# Altium footprint library con-samtec.PCBLIB: 805 footprints (part 41 of 55)
Each footprint in its own frame and in the unit in brackets; x right, y up, seen from the top. Pads: shape width x height; smd on the part's side, far side on the other; paste and mask are expansions set on the pad; w line width, h text height; cw(c..) or ccw(c..) is an arc to the next point about the centre after c.
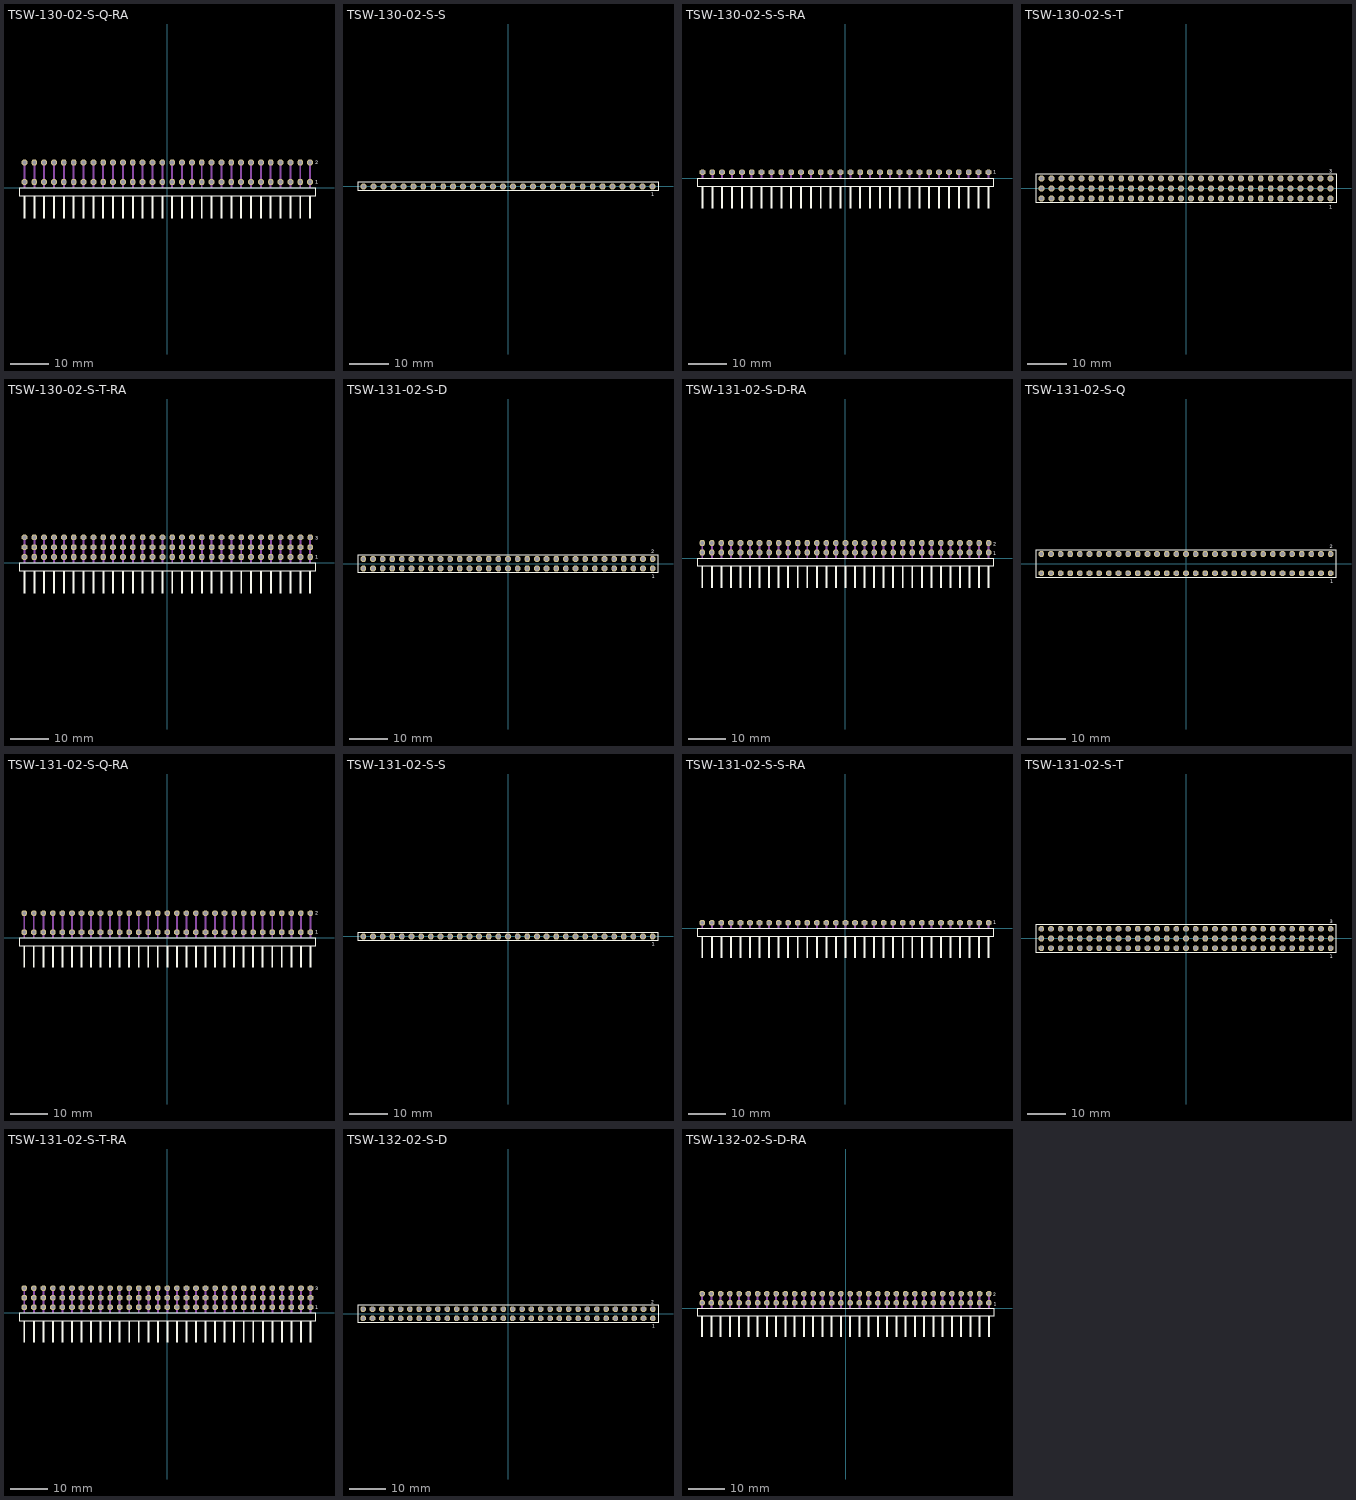
[diagram p40: the footprints below, top view; thin cyan lines are the x and y axes]

## TSW-130-02-S-Q-RA [mil]
pads (60):
  oct 59.06x59.06 hole 39.37: 1(1450,60) 2(1450,260) 3(1350,60) 4(1350,260) 5(1250,60) 6(1250,260) 7(1150,60) 8(1150,260) 9(1050,60) 10(1050,260) 11(950,60) 12(950,260) 13(850,60) 14(850,260) 15(750,60) 16(750,260) 17(650,60) 18(650,260) 19(550,60) 20(550,260) 21(450,60) 22(450,260) 23(350,60) 24(350,260) 25(250,60) 26(250,260) 27(150,60) 28(150,260) 29(50,60) 30(50,260) 31(-50,60) 32(-50,260) 33(-150,60) 34(-150,260) 35(-250,60) 36(-250,260) 37(-350,60) 38(-350,260) 39(-450,60) 40(-450,260) 41(-550,60) 42(-550,260) 43(-650,60) 44(-650,260) 45(-750,60) 46(-750,260) 47(-850,60) 48(-850,260) 49(-950,60) 50(-950,260) 51(-1050,60) 52(-1050,260) 53(-1150,60) 54(-1150,260) 55(-1250,60) 56(-1250,260) 57(-1350,60) 58(-1350,260) 59(-1450,60) 60(-1450,260)
Top Overlay:
  rectangle: -1460,-310.63 -1440,-80.32
  rectangle: -1360,-310.63 -1340,-80.32
  rectangle: -1260,-310.63 -1240,-80.32
  rectangle: -1160,-310.63 -1140,-80.32
  rectangle: -1060,-310.63 -1040,-80.32
  rectangle: -960,-310.63 -940,-80.32
  rectangle: -860,-310.63 -840,-80.32
  rectangle: -760,-310.63 -740,-80.32
  rectangle: -660,-310.63 -640,-80.32
  rectangle: -560,-310.63 -540,-80.32
  rectangle: -460,-310.63 -440,-80.32
  rectangle: -360,-310.63 -340,-80.32
  rectangle: -260,-310.63 -240,-80.32
  rectangle: -160,-310.63 -140,-80.32
  rectangle: -60,-310.63 -40,-80.32
  rectangle: 40,-310.63 60,-80.32
  rectangle: 140,-310.63 160,-80.32
  rectangle: 240,-310.63 260,-80.32
  rectangle: 340,-310.63 360,-80.32
  rectangle: 440,-310.63 460,-80.32
  rectangle: 540,-310.63 560,-80.32
  rectangle: 640,-310.63 660,-80.32
  rectangle: 740,-310.63 760,-80.32
  rectangle: 840,-310.63 860,-80.32
  rectangle: 940,-310.63 960,-80.32
  rectangle: 1040,-310.63 1060,-80.32
  rectangle: 1140,-310.63 1160,-80.32
  rectangle: 1240,-310.63 1260,-80.32
  rectangle: 1340,-310.63 1360,-80.32
  rectangle: 1440,-310.63 1460,-80.32
  lines w8: -1505.08,-80.55 1505.08,-80.55 1505.08,-4.17 -1505.08,-4.17 -1505.08,-80.55
  text "1" at 1503.54,43.31 h36.81
  text "2" at 1501.18,242.72 h36.81
Mechanical 16:
  rectangle: -1460,0 -1440,270
  rectangle: -1360,0 -1340,270
  rectangle: -1260,0 -1240,270
  rectangle: -1160,0 -1140,270
  rectangle: -1060,0 -1040,270
  rectangle: -960,0 -940,270
  rectangle: -860,0 -840,270
  rectangle: -760,0 -740,270
  rectangle: -660,0 -640,270
  rectangle: -560,0 -540,270
  rectangle: -460,0 -440,270
  rectangle: -360,0 -340,270
  rectangle: -260,0 -240,270
  rectangle: -160,0 -140,270
  rectangle: -60,0 -40,270
  rectangle: 40,0 60,270
  rectangle: 140,0 160,270
  rectangle: 240,0 260,270
  rectangle: 340,0 360,270
  rectangle: 440,0 460,270
  rectangle: 540,0 560,270
  rectangle: 640,0 660,270
  rectangle: 740,0 760,270
  rectangle: 840,0 860,270
  rectangle: 940,0 960,270
  rectangle: 1040,0 1060,270
  rectangle: 1140,0 1160,270
  rectangle: 1240,0 1260,270
  rectangle: 1340,0 1360,270
  rectangle: 1440,0 1460,270

## TSW-130-02-S-S [mm]
pads (30):
  oct 1.5x1.5 hole 1: 1(36.83,0) 2(34.29,0) 3(31.75,0) 4(29.21,0) 5(26.67,0) 6(24.13,0) 7(21.59,0) 8(19.05,0) 9(16.51,0) 10(13.97,0) 11(11.43,0) 12(8.89,0) 13(6.35,0) 14(3.81,0) 15(1.27,0) 16(-1.27,0) 17(-3.81,0) 18(-6.35,0) 19(-8.89,0) 20(-11.43,0) 21(-13.97,0) 22(-16.51,0) 23(-19.05,0) 24(-21.59,0) 25(-24.13,0) 26(-26.67,0) 27(-29.21,0) 28(-31.75,0) 29(-34.29,0) 30(-36.83,0)
Top Overlay:
  lines w0.203: -38.229,-1.155 38.229,-1.155 38.229,1.155 -38.229,1.155 -38.229,-1.155
  text "1" at 36.572,-2.498 h0.94
Mechanical 16:
  rectangle: -37.18,-0.35 -36.48,0.35
  rectangle: -34.64,-0.35 -33.94,0.35
  rectangle: -32.1,-0.35 -31.4,0.35
  rectangle: -29.56,-0.35 -28.86,0.35
  rectangle: -27.02,-0.35 -26.32,0.35
  rectangle: -24.48,-0.35 -23.78,0.35
  rectangle: -21.94,-0.35 -21.24,0.35
  rectangle: -19.4,-0.35 -18.7,0.35
  rectangle: -16.86,-0.35 -16.16,0.35
  rectangle: -14.32,-0.35 -13.62,0.35
  rectangle: -11.78,-0.35 -11.08,0.35
  rectangle: -9.24,-0.35 -8.54,0.35
  rectangle: -6.7,-0.35 -6,0.35
  rectangle: -4.16,-0.35 -3.46,0.35
  rectangle: -1.62,-0.35 -0.92,0.35
  rectangle: 0.92,-0.35 1.62,0.35
  rectangle: 3.46,-0.35 4.16,0.35
  rectangle: 6,-0.35 6.7,0.35
  rectangle: 8.54,-0.35 9.24,0.35
  rectangle: 11.08,-0.35 11.78,0.35
  rectangle: 13.62,-0.35 14.32,0.35
  rectangle: 16.16,-0.35 16.86,0.35
  rectangle: 18.7,-0.35 19.4,0.35
  rectangle: 21.24,-0.35 21.94,0.35
  rectangle: 23.78,-0.35 24.48,0.35
  rectangle: 26.32,-0.35 27.02,0.35
  rectangle: 28.86,-0.35 29.56,0.35
  rectangle: 31.4,-0.35 32.1,0.35
  rectangle: 33.94,-0.35 34.64,0.35
  rectangle: 36.48,-0.35 37.18,0.35

## TSW-130-02-S-S-RA [mil]
pads (30):
  oct 59.06x59.06 hole 39.37: 1(1450,60) 2(1350,60) 3(1250,60) 4(1150,60) 5(1050,60) 6(950,60) 7(850,60) 8(750,60) 9(650,60) 10(550,60) 11(450,60) 12(350,60) 13(250,60) 14(150,60) 15(50,60) 16(-50,60) 17(-150,60) 18(-250,60) 19(-350,60) 20(-450,60) 21(-550,60) 22(-650,60) 23(-750,60) 24(-850,60) 25(-950,60) 26(-1050,60) 27(-1150,60) 28(-1250,60) 29(-1350,60) 30(-1450,60)
Top Overlay:
  rectangle: -1460,-310.63 -1440,-80.32
  rectangle: -1360,-310.63 -1340,-80.32
  rectangle: -1260,-310.63 -1240,-80.32
  rectangle: -1160,-310.63 -1140,-80.32
  rectangle: -1060,-310.63 -1040,-80.32
  rectangle: -960,-310.63 -940,-80.32
  rectangle: -860,-310.63 -840,-80.32
  rectangle: -760,-310.63 -740,-80.32
  rectangle: -660,-310.63 -640,-80.32
  rectangle: -560,-310.63 -540,-80.32
  rectangle: -460,-310.63 -440,-80.32
  rectangle: -360,-310.63 -340,-80.32
  rectangle: -260,-310.63 -240,-80.32
  rectangle: -160,-310.63 -140,-80.32
  rectangle: -60,-310.63 -40,-80.32
  rectangle: 40,-310.63 60,-80.32
  rectangle: 140,-310.63 160,-80.32
  rectangle: 240,-310.63 260,-80.32
  rectangle: 340,-310.63 360,-80.32
  rectangle: 440,-310.63 460,-80.32
  rectangle: 540,-310.63 560,-80.32
  rectangle: 640,-310.63 660,-80.32
  rectangle: 740,-310.63 760,-80.32
  rectangle: 840,-310.63 860,-80.32
  rectangle: 940,-310.63 960,-80.32
  rectangle: 1040,-310.63 1060,-80.32
  rectangle: 1140,-310.63 1160,-80.32
  rectangle: 1240,-310.63 1260,-80.32
  rectangle: 1340,-310.63 1360,-80.32
  rectangle: 1440,-310.63 1460,-80.32
  lines w8: -1505.08,-80.55 1505.08,-80.55 1505.08,-4.17 -1505.08,-4.17 -1505.08,-80.55
  text "1" at 1500.47,45.35 h36.81
Mechanical 16:
  rectangle: -1460,0 -1440,70
  rectangle: -1360,0 -1340,70
  rectangle: -1260,0 -1240,70
  rectangle: -1160,0 -1140,70
  rectangle: -1060,0 -1040,70
  rectangle: -960,0 -940,70
  rectangle: -860,0 -840,70
  rectangle: -760,0 -740,70
  rectangle: -660,0 -640,70
  rectangle: -560,0 -540,70
  rectangle: -460,0 -440,70
  rectangle: -360,0 -340,70
  rectangle: -260,0 -240,70
  rectangle: -160,0 -140,70
  rectangle: -60,0 -40,70
  rectangle: 40,0 60,70
  rectangle: 140,0 160,70
  rectangle: 240,0 260,70
  rectangle: 340,0 360,70
  rectangle: 440,0 460,70
  rectangle: 540,0 560,70
  rectangle: 640,0 660,70
  rectangle: 740,0 760,70
  rectangle: 840,0 860,70
  rectangle: 940,0 960,70
  rectangle: 1040,0 1060,70
  rectangle: 1140,0 1160,70
  rectangle: 1240,0 1260,70
  rectangle: 1340,0 1360,70
  rectangle: 1440,0 1460,70

## TSW-130-02-S-T [mm]
pads (90):
  oct 1.5x1.5 hole 1: 1(36.83,-2.54) 2(36.83,0) 3(36.83,2.54) 4(34.29,-2.54) 5(34.29,0) 6(34.29,2.54) 7(31.75,-2.54) 8(31.75,0) 9(31.75,2.54) 10(29.21,-2.54) 11(29.21,0) 12(29.21,2.54) 13(26.67,-2.54) 14(26.67,0) 15(26.67,2.54) 16(24.13,-2.54) 17(24.13,0) 18(24.13,2.54) 19(21.59,-2.54) 20(21.59,0) 21(21.59,2.54) 22(19.05,-2.54) 23(19.05,0) 24(19.05,2.54) 25(16.51,-2.54) 26(16.51,0) 27(16.51,2.54) 28(13.97,-2.54) 29(13.97,0) 30(13.97,2.54) 31(11.43,-2.54) 32(11.43,0) 33(11.43,2.54) 34(8.89,-2.54) 35(8.89,0) 36(8.89,2.54) 37(6.35,-2.54) 38(6.35,0) 39(6.35,2.54) 40(3.81,-2.54) 41(3.81,0) 42(3.81,2.54) 43(1.27,-2.54) 44(1.27,0) 45(1.27,2.54) 46(-1.27,-2.54) 47(-1.27,0) 48(-1.27,2.54) 49(-3.81,-2.54) 50(-3.81,0) 51(-3.81,2.54) 52(-6.35,-2.54) 53(-6.35,0) 54(-6.35,2.54) 55(-8.89,-2.54) 56(-8.89,0) 57(-8.89,2.54) 58(-11.43,-2.54) 59(-11.43,0) 60(-11.43,2.54) 61(-13.97,-2.54) 62(-13.97,0) 63(-13.97,2.54) 64(-16.51,-2.54) 65(-16.51,0) 66(-16.51,2.54) 67(-19.05,-2.54) 68(-19.05,0) 69(-19.05,2.54) 70(-21.59,-2.54) 71(-21.59,0) 72(-21.59,2.54) 73(-24.13,-2.54) 74(-24.13,0) 75(-24.13,2.54) 76(-26.67,-2.54) 77(-26.67,0) 78(-26.67,2.54) 79(-29.21,-2.54) 80(-29.21,0) 81(-29.21,2.54) 82(-31.75,-2.54) 83(-31.75,0) 84(-31.75,2.54) 85(-34.29,-2.54) 86(-34.29,0) 87(-34.29,2.54) 88(-36.83,-2.54) 89(-36.83,0) 90(-36.83,2.54)
Top Overlay:
  lines w0.203: -38.229,-3.695 38.229,-3.695 38.229,3.695 -38.229,3.695 -38.229,-3.695
  text "1" at 36.522,-5.188 h0.94
  text "3" at 36.518,3.989 h0.94
Mechanical 16:
  rectangle: -37.18,-2.89 -36.48,-2.19
  rectangle: -37.18,-0.35 -36.48,0.35
  rectangle: -37.18,2.19 -36.48,2.89
  rectangle: -34.64,-2.89 -33.94,-2.19
  rectangle: -34.64,-0.35 -33.94,0.35
  rectangle: -34.64,2.19 -33.94,2.89
  rectangle: -32.1,-2.89 -31.4,-2.19
  rectangle: -32.1,-0.35 -31.4,0.35
  rectangle: -32.1,2.19 -31.4,2.89
  rectangle: -29.56,-2.89 -28.86,-2.19
  rectangle: -29.56,-0.35 -28.86,0.35
  rectangle: -29.56,2.19 -28.86,2.89
  rectangle: -27.02,-2.89 -26.32,-2.19
  rectangle: -27.02,-0.35 -26.32,0.35
  rectangle: -27.02,2.19 -26.32,2.89
  rectangle: -24.48,-2.89 -23.78,-2.19
  rectangle: -24.48,-0.35 -23.78,0.35
  rectangle: -24.48,2.19 -23.78,2.89
  rectangle: -21.94,-2.89 -21.24,-2.19
  rectangle: -21.94,-0.35 -21.24,0.35
  rectangle: -21.94,2.19 -21.24,2.89
  rectangle: -19.4,-2.89 -18.7,-2.19
  rectangle: -19.4,-0.35 -18.7,0.35
  rectangle: -19.4,2.19 -18.7,2.89
  rectangle: -16.86,-2.89 -16.16,-2.19
  rectangle: -16.86,-0.35 -16.16,0.35
  rectangle: -16.86,2.19 -16.16,2.89
  rectangle: -14.32,-2.89 -13.62,-2.19
  rectangle: -14.32,-0.35 -13.62,0.35
  rectangle: -14.32,2.19 -13.62,2.89
  rectangle: -11.78,-2.89 -11.08,-2.19
  rectangle: -11.78,-0.35 -11.08,0.35
  rectangle: -11.78,2.19 -11.08,2.89
  rectangle: -9.24,-2.89 -8.54,-2.19
  rectangle: -9.24,-0.35 -8.54,0.35
  rectangle: -9.24,2.19 -8.54,2.89
  rectangle: -6.7,-2.89 -6,-2.19
  rectangle: -6.7,-0.35 -6,0.35
  rectangle: -6.7,2.19 -6,2.89
  rectangle: -4.16,-2.89 -3.46,-2.19
  rectangle: -4.16,-0.35 -3.46,0.35
  rectangle: -4.16,2.19 -3.46,2.89
  rectangle: -1.62,-2.89 -0.92,-2.19
  rectangle: -1.62,-0.35 -0.92,0.35
  rectangle: -1.62,2.19 -0.92,2.89
  rectangle: 0.92,-2.89 1.62,-2.19
  rectangle: 0.92,-0.35 1.62,0.35
  rectangle: 0.92,2.19 1.62,2.89
  rectangle: 3.46,-2.89 4.16,-2.19
  rectangle: 3.46,-0.35 4.16,0.35
  rectangle: 3.46,2.19 4.16,2.89
  rectangle: 6,-2.89 6.7,-2.19
  rectangle: 6,-0.35 6.7,0.35
  rectangle: 6,2.19 6.7,2.89
  rectangle: 8.54,-2.89 9.24,-2.19
  rectangle: 8.54,-0.35 9.24,0.35
  rectangle: 8.54,2.19 9.24,2.89
  rectangle: 11.08,-2.89 11.78,-2.19
  rectangle: 11.08,-0.35 11.78,0.35
  rectangle: 11.08,2.19 11.78,2.89
  rectangle: 13.62,-2.89 14.32,-2.19
  rectangle: 13.62,-0.35 14.32,0.35
  rectangle: 13.62,2.19 14.32,2.89
  rectangle: 16.16,-2.89 16.86,-2.19
  rectangle: 16.16,-0.35 16.86,0.35
  rectangle: 16.16,2.19 16.86,2.89
  rectangle: 18.7,-2.89 19.4,-2.19
  rectangle: 18.7,-0.35 19.4,0.35
  rectangle: 18.7,2.19 19.4,2.89
  rectangle: 21.24,-2.89 21.94,-2.19
  rectangle: 21.24,-0.35 21.94,0.35
  rectangle: 21.24,2.19 21.94,2.89
  rectangle: 23.78,-2.89 24.48,-2.19
  rectangle: 23.78,-0.35 24.48,0.35
  rectangle: 23.78,2.19 24.48,2.89
  rectangle: 26.32,-2.89 27.02,-2.19
  rectangle: 26.32,-0.35 27.02,0.35
  rectangle: 26.32,2.19 27.02,2.89
  rectangle: 28.86,-2.89 29.56,-2.19
  rectangle: 28.86,-0.35 29.56,0.35
  rectangle: 28.86,2.19 29.56,2.89
  rectangle: 31.4,-2.89 32.1,-2.19
  rectangle: 31.4,-0.35 32.1,0.35
  rectangle: 31.4,2.19 32.1,2.89
  rectangle: 33.94,-2.89 34.64,-2.19
  rectangle: 33.94,-0.35 34.64,0.35
  rectangle: 33.94,2.19 34.64,2.89
  rectangle: 36.48,-2.89 37.18,-2.19
  rectangle: 36.48,-0.35 37.18,0.35
  rectangle: 36.48,2.19 37.18,2.89

## TSW-130-02-S-T-RA [mil]
pads (90):
  oct 59.06x59.06 hole 39.37: 1(1450,60) 2(1450,160) 3(1450,260) 4(1350,60) 5(1350,160) 6(1350,260) 7(1250,60) 8(1250,160) 9(1250,260) 10(1150,60) 11(1150,160) 12(1150,260) 13(1050,60) 14(1050,160) 15(1050,260) 16(950,60) 17(950,160) 18(950,260) 19(850,60) 20(850,160) 21(850,260) 22(750,60) 23(750,160) 24(750,260) 25(650,60) 26(650,160) 27(650,260) 28(550,60) 29(550,160) 30(550,260) 31(450,60) 32(450,160) 33(450,260) 34(350,60) 35(350,160) 36(350,260) 37(250,60) 38(250,160) 39(250,260) 40(150,60) 41(150,160) 42(150,260) 43(50,60) 44(50,160) 45(50,260) 46(-50,60) 47(-50,160) 48(-50,260) 49(-150,60) 50(-150,160) 51(-150,260) 52(-250,60) 53(-250,160) 54(-250,260) 55(-350,60) 56(-350,160) 57(-350,260) 58(-450,60) 59(-450,160) 60(-450,260) 61(-550,60) 62(-550,160) 63(-550,260) 64(-650,60) 65(-650,160) 66(-650,260) 67(-750,60) 68(-750,160) 69(-750,260) 70(-850,60) 71(-850,160) 72(-850,260) 73(-950,60) 74(-950,160) 75(-950,260) 76(-1050,60) 77(-1050,160) 78(-1050,260) 79(-1150,60) 80(-1150,160) 81(-1150,260) 82(-1250,60) 83(-1250,160) 84(-1250,260) 85(-1350,60) 86(-1350,160) 87(-1350,260) 88(-1450,60) 89(-1450,160) 90(-1450,260)
Top Overlay:
  rectangle: -1460,-310.63 -1440,-80.32
  rectangle: -1360,-310.63 -1340,-80.32
  rectangle: -1260,-310.63 -1240,-80.32
  rectangle: -1160,-310.63 -1140,-80.32
  rectangle: -1060,-310.63 -1040,-80.32
  rectangle: -960,-310.63 -940,-80.32
  rectangle: -860,-310.63 -840,-80.32
  rectangle: -760,-310.63 -740,-80.32
  rectangle: -660,-310.63 -640,-80.32
  rectangle: -560,-310.63 -540,-80.32
  rectangle: -460,-310.63 -440,-80.32
  rectangle: -360,-310.63 -340,-80.32
  rectangle: -260,-310.63 -240,-80.32
  rectangle: -160,-310.63 -140,-80.32
  rectangle: -60,-310.63 -40,-80.32
  rectangle: 40,-310.63 60,-80.32
  rectangle: 140,-310.63 160,-80.32
  rectangle: 240,-310.63 260,-80.32
  rectangle: 340,-310.63 360,-80.32
  rectangle: 440,-310.63 460,-80.32
  rectangle: 540,-310.63 560,-80.32
  rectangle: 640,-310.63 660,-80.32
  rectangle: 740,-310.63 760,-80.32
  rectangle: 840,-310.63 860,-80.32
  rectangle: 940,-310.63 960,-80.32
  rectangle: 1040,-310.63 1060,-80.32
  rectangle: 1140,-310.63 1160,-80.32
  rectangle: 1240,-310.63 1260,-80.32
  rectangle: 1340,-310.63 1360,-80.32
  rectangle: 1440,-310.63 1460,-80.32
  lines w8: -1505.08,-80.55 1505.08,-80.55 1505.08,-4.17 -1505.08,-4.17 -1505.08,-80.55
  text "1" at 1501.57,41.34 h36.81
  text "3" at 1502.17,236.81 h36.81
Mechanical 16:
  rectangle: -1460,0 -1440,270
  rectangle: -1360,0 -1340,270
  rectangle: -1260,0 -1240,270
  rectangle: -1160,0 -1140,270
  rectangle: -1060,0 -1040,270
  rectangle: -960,0 -940,270
  rectangle: -860,0 -840,270
  rectangle: -760,0 -740,270
  rectangle: -660,0 -640,270
  rectangle: -560,0 -540,270
  rectangle: -460,0 -440,270
  rectangle: -360,0 -340,270
  rectangle: -260,0 -240,270
  rectangle: -160,0 -140,270
  rectangle: -60,0 -40,270
  rectangle: 40,0 60,270
  rectangle: 140,0 160,270
  rectangle: 240,0 260,270
  rectangle: 340,0 360,270
  rectangle: 440,0 460,270
  rectangle: 540,0 560,270
  rectangle: 640,0 660,270
  rectangle: 740,0 760,270
  rectangle: 840,0 860,270
  rectangle: 940,0 960,270
  rectangle: 1040,0 1060,270
  rectangle: 1140,0 1160,270
  rectangle: 1240,0 1260,270
  rectangle: 1340,0 1360,270
  rectangle: 1440,0 1460,270

## TSW-131-02-S-D [mm]
pads (62):
  oct 1.5x1.5 hole 1: 1(38.1,-1.27) 2(38.1,1.27) 3(35.56,-1.27) 4(35.56,1.27) 5(33.02,-1.27) 6(33.02,1.27) 7(30.48,-1.27) 8(30.48,1.27) 9(27.94,-1.27) 10(27.94,1.27) 11(25.4,-1.27) 12(25.4,1.27) 13(22.86,-1.27) 14(22.86,1.27) 15(20.32,-1.27) 16(20.32,1.27) 17(17.78,-1.27) 18(17.78,1.27) 19(15.24,-1.27) 20(15.24,1.27) 21(12.7,-1.27) 22(12.7,1.27) 23(10.16,-1.27) 24(10.16,1.27) 25(7.62,-1.27) 26(7.62,1.27) 27(5.08,-1.27) 28(5.08,1.27) 29(2.54,-1.27) 30(2.54,1.27) 31(0,-1.27) 32(0,1.27) 33(-2.54,-1.27) 34(-2.54,1.27) 35(-5.08,-1.27) 36(-5.08,1.27) 37(-7.62,-1.27) 38(-7.62,1.27) 39(-10.16,-1.27) 40(-10.16,1.27) 41(-12.7,-1.27) 42(-12.7,1.27) 43(-15.24,-1.27) 44(-15.24,1.27) 45(-17.78,-1.27) 46(-17.78,1.27) 47(-20.32,-1.27) 48(-20.32,1.27) 49(-22.86,-1.27) 50(-22.86,1.27) 51(-25.4,-1.27) 52(-25.4,1.27) 53(-27.94,-1.27) 54(-27.94,1.27) 55(-30.48,-1.27) 56(-30.48,1.27) 57(-33.02,-1.27) 58(-33.02,1.27) 59(-35.56,-1.27) 60(-35.56,1.27) 61(-38.1,-1.27) 62(-38.1,1.27)
Top Overlay:
  lines w0.203: -39.499,-2.425 39.499,-2.425 39.499,2.425 -39.499,2.425 -39.499,-2.425
  text "1" at 37.892,-3.818 h0.94
  text "2" at 37.717,2.744 h0.94
Mechanical 16:
  rectangle: -38.45,-1.62 -37.75,-0.92
  rectangle: -38.45,0.92 -37.75,1.62
  rectangle: -35.91,-1.62 -35.21,-0.92
  rectangle: -35.91,0.92 -35.21,1.62
  rectangle: -33.37,-1.62 -32.67,-0.92
  rectangle: -33.37,0.92 -32.67,1.62
  rectangle: -30.83,-1.62 -30.13,-0.92
  rectangle: -30.83,0.92 -30.13,1.62
  rectangle: -28.29,-1.62 -27.59,-0.92
  rectangle: -28.29,0.92 -27.59,1.62
  rectangle: -25.75,-1.62 -25.05,-0.92
  rectangle: -25.75,0.92 -25.05,1.62
  rectangle: -23.21,-1.62 -22.51,-0.92
  rectangle: -23.21,0.92 -22.51,1.62
  rectangle: -20.67,-1.62 -19.97,-0.92
  rectangle: -20.67,0.92 -19.97,1.62
  rectangle: -18.13,-1.62 -17.43,-0.92
  rectangle: -18.13,0.92 -17.43,1.62
  rectangle: -15.59,-1.62 -14.89,-0.92
  rectangle: -15.59,0.92 -14.89,1.62
  rectangle: -13.05,-1.62 -12.35,-0.92
  rectangle: -13.05,0.92 -12.35,1.62
  rectangle: -10.51,-1.62 -9.81,-0.92
  rectangle: -10.51,0.92 -9.81,1.62
  rectangle: -7.97,-1.62 -7.27,-0.92
  rectangle: -7.97,0.92 -7.27,1.62
  rectangle: -5.43,-1.62 -4.73,-0.92
  rectangle: -5.43,0.92 -4.73,1.62
  rectangle: -2.89,-1.62 -2.19,-0.92
  rectangle: -2.89,0.92 -2.19,1.62
  rectangle: -0.35,-1.62 0.35,-0.92
  rectangle: -0.35,0.92 0.35,1.62
  rectangle: 2.19,-1.62 2.89,-0.92
  rectangle: 2.19,0.92 2.89,1.62
  rectangle: 4.73,-1.62 5.43,-0.92
  rectangle: 4.73,0.92 5.43,1.62
  rectangle: 7.27,-1.62 7.97,-0.92
  rectangle: 7.27,0.92 7.97,1.62
  rectangle: 9.81,-1.62 10.51,-0.92
  rectangle: 9.81,0.92 10.51,1.62
  rectangle: 12.35,-1.62 13.05,-0.92
  rectangle: 12.35,0.92 13.05,1.62
  rectangle: 14.89,-1.62 15.59,-0.92
  rectangle: 14.89,0.92 15.59,1.62
  rectangle: 17.43,-1.62 18.13,-0.92
  rectangle: 17.43,0.92 18.13,1.62
  rectangle: 19.97,-1.62 20.67,-0.92
  rectangle: 19.97,0.92 20.67,1.62
  rectangle: 22.51,-1.62 23.21,-0.92
  rectangle: 22.51,0.92 23.21,1.62
  rectangle: 25.05,-1.62 25.75,-0.92
  rectangle: 25.05,0.92 25.75,1.62
  rectangle: 27.59,-1.62 28.29,-0.92
  rectangle: 27.59,0.92 28.29,1.62
  rectangle: 30.13,-1.62 30.83,-0.92
  rectangle: 30.13,0.92 30.83,1.62
  rectangle: 32.67,-1.62 33.37,-0.92
  rectangle: 32.67,0.92 33.37,1.62
  rectangle: 35.21,-1.62 35.91,-0.92
  rectangle: 35.21,0.92 35.91,1.62
  rectangle: 37.75,-1.62 38.45,-0.92
  rectangle: 37.75,0.92 38.45,1.62

## TSW-131-02-S-D-RA [mil]
pads (62):
  oct 59.06x59.06 hole 39.37: 1(1500,60) 2(1500,160) 3(1400,60) 4(1400,160) 5(1300,60) 6(1300,160) 7(1200,60) 8(1200,160) 9(1100,60) 10(1100,160) 11(1000,60) 12(1000,160) 13(900,60) 14(900,160) 15(800,60) 16(800,160) 17(700,60) 18(700,160) 19(600,60) 20(600,160) 21(500,60) 22(500,160) 23(400,60) 24(400,160) 25(300,60) 26(300,160) 27(200,60) 28(200,160) 29(100,60) 30(100,160) 31(0,60) 32(0,160) 33(-100,60) 34(-100,160) 35(-200,60) 36(-200,160) 37(-300,60) 38(-300,160) 39(-400,60) 40(-400,160) 41(-500,60) 42(-500,160) 43(-600,60) 44(-600,160) 45(-700,60) 46(-700,160) 47(-800,60) 48(-800,160) 49(-900,60) 50(-900,160) 51(-1000,60) 52(-1000,160) 53(-1100,60) 54(-1100,160) 55(-1200,60) 56(-1200,160) 57(-1300,60) 58(-1300,160) 59(-1400,60) 60(-1400,160) 61(-1500,60) 62(-1500,160)
Top Overlay:
  rectangle: -1510,-310.63 -1490,-80.32
  rectangle: -1410,-310.63 -1390,-80.32
  rectangle: -1310,-310.63 -1290,-80.32
  rectangle: -1210,-310.63 -1190,-80.32
  rectangle: -1110,-310.63 -1090,-80.32
  rectangle: -1010,-310.63 -990,-80.32
  rectangle: -910,-310.63 -890,-80.32
  rectangle: -810,-310.63 -790,-80.32
  rectangle: -710,-310.63 -690,-80.32
  rectangle: -610,-310.63 -590,-80.32
  rectangle: -510,-310.63 -490,-80.32
  rectangle: -410,-310.63 -390,-80.32
  rectangle: -310,-310.63 -290,-80.32
  rectangle: -210,-310.63 -190,-80.32
  rectangle: -110,-310.63 -90,-80.32
  rectangle: -10,-310.63 10,-80.32
  rectangle: 90,-310.63 110,-80.32
  rectangle: 190,-310.63 210,-80.32
  rectangle: 290,-310.63 310,-80.32
  rectangle: 390,-310.63 410,-80.32
  rectangle: 490,-310.63 510,-80.32
  rectangle: 590,-310.63 610,-80.32
  rectangle: 690,-310.63 710,-80.32
  rectangle: 790,-310.63 810,-80.32
  rectangle: 890,-310.63 910,-80.32
  rectangle: 990,-310.63 1010,-80.32
  rectangle: 1090,-310.63 1110,-80.32
  rectangle: 1190,-310.63 1210,-80.32
  rectangle: 1290,-310.63 1310,-80.32
  rectangle: 1390,-310.63 1410,-80.32
  rectangle: 1490,-310.63 1510,-80.32
  lines w8: -1555.08,-80.55 1555.08,-80.55 1555.08,-4.17 -1555.08,-4.17 -1555.08,-80.55
  text "1" at 1550.59,30.51 h36.81
  text "2" at 1549.21,129.53 h36.81
Mechanical 16:
  rectangle: -1510,0 -1490,170
  rectangle: -1410,0 -1390,170
  rectangle: -1310,0 -1290,170
  rectangle: -1210,0 -1190,170
  rectangle: -1110,0 -1090,170
  rectangle: -1010,0 -990,170
  rectangle: -910,0 -890,170
  rectangle: -810,0 -790,170
  rectangle: -710,0 -690,170
  rectangle: -610,0 -590,170
  rectangle: -510,0 -490,170
  rectangle: -410,0 -390,170
  rectangle: -310,0 -290,170
  rectangle: -210,0 -190,170
  rectangle: -110,0 -90,170
  rectangle: -10,0 10,170
  rectangle: 90,0 110,170
  rectangle: 190,0 210,170
  rectangle: 290,0 310,170
  rectangle: 390,0 410,170
  rectangle: 490,0 510,170
  rectangle: 590,0 610,170
  rectangle: 690,0 710,170
  rectangle: 790,0 810,170